# Altium footprint library CUSTOM PCB.PcbLib: 404 footprints (part 4 of 26)
Each footprint in its own frame and in the unit in brackets; x right, y up, seen from the top. Pads: shape width x height; smd on the part's side, far side on the other; paste and mask are expansions set on the pad; w line width, h text height; cw(c..) or ccw(c..) is an arc to the next point about the centre after c.
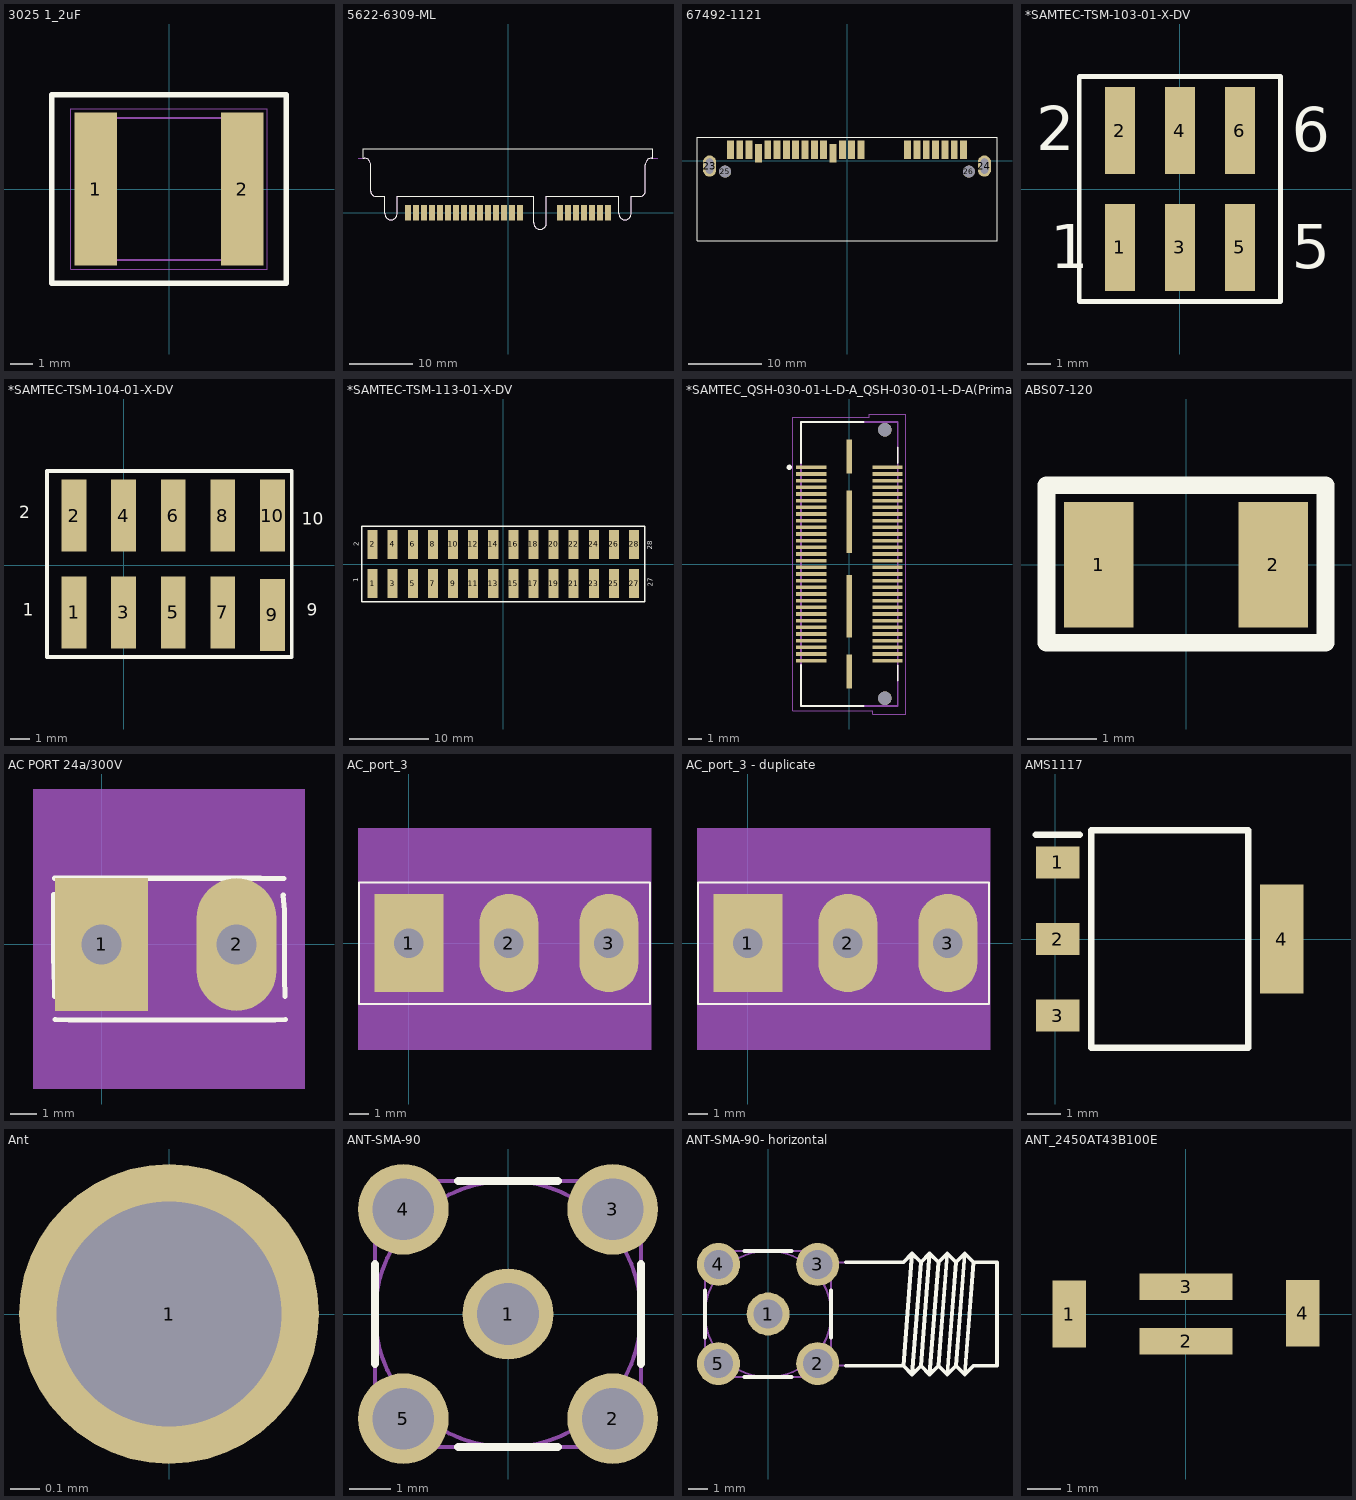
[diagram p3: the footprints below, top view; thin cyan lines are the x and y axes]

## 3025 1_2uF [mm]
pads (2):
  rect 1.89x6.81 smd: 1(-3.26,0) 2(3.26,0)
Top Overlay:
  lines w0.254: -5.207,-4.191 -5.207,4.191 5.207,4.191 5.207,-4.191 -5.207,-4.191
Mechanical 15:
  lines w0.1: -3.75,-3.15 -3.75,3.15 3.75,3.15 3.75,-3.15 -3.75,-3.15
Mechanical 20:
  lines w0.05: -4.355,-3.56 -4.355,3.56 4.355,3.56 4.355,-3.56 -4.355,-3.56
3D body "KTS501B125M76N0T00.stp": height 3.5, standoff 0, extent -3.75,-3.15 3.75,3.15

## 5622-6309-ML [mm]
pads (22):
  rect 0.94x2.5 smd: 1(15.875,0) 2(14.605,0) 3(13.335,0) 4(12.065,0) 5(10.795,0) 6(9.525,0) 7(8.255,0) 8(1.905,0) 9(0.635,0) 10(-0.635,0) 11(-1.905,0) 12(-3.175,0) 13(-4.445,0) 14(-5.715,0) 15(-6.985,0) 16(-8.255,0) 17(-9.525,0) 18(-10.795,0) 19(-12.065,0) 20(-13.335,0) 21(-14.605,0) 22(-15.875,0)
Top Overlay:
  lines w0.127: -22.936,8.65 -22.936,8.796 -22.936,10.16 22.936,10.16 22.936,8.806 22.936,8.65 22.78,8.65 ccw(c22.78,7.65) 21.78,7.65 21.78,3.41 cw(c21.02,3.41) 21.02,2.65 19.545,2.65 19.545,-0.1 cw(c18.545,-0.1) 17.545,-0.1 17.545,2.65 6.075,2.65 6.075,-1.62 cw(c5.075,-1.62) 4.075,-1.62 4.075,2.65 -17.555,2.65 -17.555,-0.1 cw(c-18.555,-0.1) -19.555,-0.1 -19.555,2.65 -21.03,2.65 cw(c-21.03,3.41) -21.79,3.41 -21.79,7.65 ccw(c-22.79,7.65) -22.79,8.65 -22.936,8.65
Mechanical 2:
  lines w0.127: -23.774,8.65 -22.79,8.65 cw(c-22.79,7.65) -21.79,7.65 -21.79,3.41 ccw(c-21.03,3.41) -21.03,2.65 -19.555,2.65 -19.555,-0.1 ccw(c-18.555,-0.1) -17.555,-0.1 -17.555,2.65 4.075,2.65 4.075,-1.62 ccw(c5.075,-1.62) 6.075,-1.62 6.075,2.65 17.545,2.65 17.545,-0.1 ccw(c18.545,-0.1) 19.545,-0.1 19.545,2.65 21.02,2.65 ccw(c21.02,3.41) 21.78,3.41 21.78,7.65 cw(c22.78,7.65) 22.78,8.65 23.764,8.65
3D body "5622-6309-ML.stp": height 3.8, standoff -1.93, extent -22.88,-2 22.88,10

## 67492-1121 [mil]
pads (26):
  rect 37x98 smd: 1(625,59.06) 2(575,59.06) 3(525,59.06) 4(475,59.06) 5(425,59.06) 6(375,59.06) 7(325,59.06) 8(75,59.06) 9(25,59.06) 10(-25,59.06) 11(-75,39.37) 12(-125,59.06) 13(-175,59.06) 14(-225,59.06) 15(-275,59.06) 16(-325,59.06) 17(-375,59.06) 18(-425,59.06) 19(-475,39.37) 20(-525,59.06) 21(-575,59.06) 22(-625,59.06)
  oval 70.87x113.39 / inner round 64 / far side round 64 hole 81.89 slot 39.37 at 0 deg: 23(-736.61,-29.13) 24(736.61,-29.13)
  round 64 hole 64: 25(-653.35,-59.06) 26(653.35,-59.06)
Top Overlay:
  lines w6: -804,-429 804,-429 804,125 -804,125 -804,-429
3D body "674921121.stp": height 139.76, standoff -78.74, extent -795.86,-425.19 795.87,81.5

## *SAMTEC-TSM-103-01-X-DV [mm]
pads (6):
  rect 1.27x3.68 smd: 1(-2.54,-2.476) 2(-2.54,2.476) 3(0,-2.476) 4(0,2.476) 5(2.54,-2.476) 6(2.54,2.476)
Top Overlay:
  lines w0.2: -4.26,-4.768 -4.26,4.768 4.26,4.768 4.26,-4.768 -4.26,-4.768
  text "1" at -5.496,-3.362 h1.88
  text "2" at -6.096,1.651 h1.88
  text "5" at 4.737,-3.362 h1.88
  text "6" at 4.737,1.592 h1.88
Top Paste:
  region: -3.175,-0.636 -1.905,-0.636 -1.905,-4.316 -3.175,-4.316
  region: -3.175,4.316 -1.905,4.316 -1.905,0.636 -3.175,0.636
  region: -0.635,-0.636 0.635,-0.636 0.635,-4.316 -0.635,-4.316
  region: -0.635,4.316 0.635,4.316 0.635,0.636 -0.635,0.636
  region: 1.905,-0.636 3.175,-0.636 3.175,-4.316 1.905,-4.316
  region: 1.905,4.316 3.175,4.316 3.175,0.636 1.905,0.636
Top Solder:
  region: -3.226,-0.585 -1.854,-0.585 -1.854,-4.367 -3.226,-4.367
  region: -3.226,4.367 -1.854,4.367 -1.854,0.585 -3.226,0.585
  region: -0.686,-0.585 0.686,-0.585 0.686,-4.367 -0.686,-4.367
  region: -0.686,4.367 0.686,4.367 0.686,0.585 -0.686,0.585
  region: 1.854,-0.585 3.226,-0.585 3.226,-4.367 1.854,-4.367
  region: 1.854,4.367 3.226,4.367 3.226,0.585 1.854,0.585
3D body "TSM-103-02-S-DV-TR.stp": height 11.94, standoff 0, extent -3.81,-3.721 3.81,3.721

## *SAMTEC-TSM-104-01-X-DV [mm]
pads (10):
  rect 1.27x3.68 smd: 1(-2.54,-2.412) 2(-2.54,2.54) 3(0,-2.412) 4(0,2.54) 5(2.54,-2.412) 6(2.54,2.54) 7(5.08,-2.412) 8(5.08,2.54) 9(7.62,-2.54) 10(7.62,2.54)
Top Overlay:
  lines w0.2: -3.918,-4.704 8.611,-4.704 8.611,4.832 -3.918,4.832 -3.918,-4.704
  text "10" at 9.119,2.071 h0.64
  text "9" at 9.373,-2.578 h0.64
  text "2" at -5.359,2.401 h0.64
  text "1" at -5.156,-2.578 h0.64
Top Paste:
  region: 1.905,4.38 3.175,4.38 3.175,0.7 1.905,0.7
  region: 1.905,-0.572 3.175,-0.572 3.175,-4.252 1.905,-4.252
  region: -0.635,4.38 0.635,4.38 0.635,0.7 -0.635,0.7
  region: -0.635,-0.572 0.635,-0.572 0.635,-4.252 -0.635,-4.252
  region: -3.175,4.38 -1.905,4.38 -1.905,0.7 -3.175,0.7
  region: -3.175,-0.572 -1.905,-0.572 -1.905,-4.252 -3.175,-4.252
Top Solder:
  region: 1.854,4.431 3.226,4.431 3.226,0.649 1.854,0.649
  region: 1.854,-0.521 3.226,-0.521 3.226,-4.303 1.854,-4.303
  region: -0.686,4.431 0.686,4.431 0.686,0.649 -0.686,0.649
  region: -0.686,-0.521 0.686,-0.521 0.686,-4.303 -0.686,-4.303
  region: -3.226,4.431 -1.854,4.431 -1.854,0.649 -3.226,0.649
  region: -3.226,-0.521 -1.854,-0.521 -1.854,-4.303 -3.226,-4.303
3D body "TSM-105-01-S-DV.stp": height 9.6, standoff -0.05, extent -3.81,-3.848 8.89,3.848

## *SAMTEC-TSM-113-01-X-DV [mm]
pads (28):
  rect 1.27x3.68 smd: 1(-16.51,-2.476) 2(-16.51,2.476) 3(-13.97,-2.476) 4(-13.97,2.476) 5(-11.43,-2.476) 6(-11.43,2.476) 7(-8.89,-2.476) 8(-8.89,2.476) 9(-6.35,-2.476) 10(-6.35,2.476) 11(-3.81,-2.476) 12(-3.81,2.476) 13(-1.27,-2.476) 14(-1.27,2.476) 15(1.27,-2.476) 16(1.27,2.476) 17(3.81,-2.476) 18(3.81,2.476) 19(6.35,-2.476) 20(6.35,2.476) 21(8.89,-2.476) 22(8.89,2.476) 23(11.43,-2.476) 24(11.43,2.476) 25(13.97,-2.476) 26(13.97,2.476) 27(16.51,-2.476) 28(16.51,2.476)
Top Overlay:
  lines w0.2: -17.888,-4.768 -5.359,-4.768 15.342,-4.768 17.882,-4.768 17.882,4.768 15.342,4.768 -5.359,4.768 -17.888,4.768 -17.888,-4.768
  text "2" at -18.237,2.261 h0.64
  text "1" at -18.288,-2.286 h0.64
  text "27" at 18.898,-2.87 h0.64
  text "28" at 18.821,1.803 h0.64
3D body "TSM-114-01-L-DV.stp": height 9.61, standoff -0.04, extent -17.78,-3.848 17.78,3.848

## *SAMTEC_QSH-030-01-L-D-A_QSH-030-01-L-D-A(Primary) [mm]
pads (66):
  rect 2.27x0.279 smd: 1(-2.865,7.25) 2(2.865,7.25) 3(-2.865,6.75) 4(2.865,6.75) 5(-2.865,6.25) 6(2.865,6.25) 7(-2.865,5.75) 8(2.865,5.75) 9(-2.865,5.25) 10(2.865,5.25) 11(-2.865,4.75) 12(2.865,4.75) 13(-2.865,4.25) 14(2.865,4.25) 15(-2.865,3.75) 16(2.865,3.75) 17(-2.865,3.25) 18(2.865,3.25) 19(-2.865,2.75) 20(2.865,2.75) 21(-2.865,2.25) 22(2.865,2.25) 23(-2.865,1.75) 24(2.865,1.75) 25(-2.865,1.25) 26(2.865,1.25) 27(-2.865,0.75) 28(2.865,0.75) 29(-2.865,0.25) 30(2.865,0.25) 31(-2.865,-0.25) 32(2.865,-0.25) 33(-2.865,-0.75) 34(2.865,-0.75) 35(-2.865,-1.25) 36(2.865,-1.25) 37(-2.865,-1.75) 38(2.865,-1.75) 39(-2.865,-2.25) 40(2.865,-2.25) 41(-2.865,-2.75) 42(2.865,-2.75) 43(-2.865,-3.25) 44(2.865,-3.25) 45(-2.865,-3.75) 46(2.865,-3.75) 47(-2.865,-4.25) 48(2.865,-4.25) 49(-2.865,-4.75) 50(2.865,-4.75) 51(-2.865,-5.25) 52(2.865,-5.25) 53(-2.865,-5.75) 54(2.865,-5.75) 55(-2.865,-6.25) 56(2.865,-6.25) 57(-2.865,-6.75) 58(2.865,-6.75) 59(-2.865,-7.25) 60(2.865,-7.25)
  round 1.02 hole 1.02 unplated: None(2.67,-10.065) None(2.67,10.065)
  rect 0.43x2.54 smd: SH1(0,8.065) SH4(0,-8.065)
  rect 0.43x4.7 smd: SH2(0,3.175) SH3(0,-3.175)
Top Overlay:
  circle w0.2: c-4.5,7.25 r0.1
  lines w0.127: -3.62,-7.55 -3.62,-10.655 1.08,-10.655 ; -3.62,7.55 -3.62,10.655 1.08,10.655 ; 3.62,-8.75 3.62,-7.6 ; 3.62,7.55 3.62,8.75
Mechanical 4:
  lines w0.127: -3.62,-10.655 3.62,-10.655 ; -3.62,-10.655 -3.62,10.655 ; -3.62,-10.655 3.62,-10.655 ; -3.62,-10.655 -3.62,10.655 ; -3.62,10.655 3.62,10.655 ; -3.62,10.655 3.62,10.655 ; 3.62,-10.655 3.62,10.655 ; 3.62,-10.655 3.62,10.655
Mechanical 16:
  lines w0.05: -4.25,-11 -4.25,11 1.5,11 1.5,11.25 4.25,11.25 4.25,-11.25 1.75,-11.25 1.75,-11 -4.25,-11
3D body "Samtec-QSH-030-01-L-D-A.stp": height 3.25, standoff -0.75, extent -3.746,-10.617 3.747,10.693

## ABS07-120 [mm]
pads (2):
  rect 1x1.8 smd: 1(-1.25,0) 2(1.25,0)
Top Overlay:
  lines w0.254: -2,-1.118 2,-1.118 2,1.143 -2,1.143 -2,-1.118
3D body "ABS07-120.STEP": height 0.89, standoff 0, extent -1.603,-0.752 1.603,0.752

## AC PORT 24a/300V [mm] "Connector; Header; 2 Position"
pads (2):
  rect 3.5x5 hole 1.5: 1(0,0)
  oval 3x5 hole 1.5: 2(5.08,0)
Top Overlay:
  lines w0.19: -1.8,-0.67 -1.78,-1.96 ; -1.748,-2.834 -1.218,-2.844 ; 5.978,2.494 6.871,2.484 ; 6.529,-2.844 6.932,-2.834 ; 6.84,1.86 6.89,1.28 ; 6.89,-1.26 6.9,-1.96
  lines w0.2: -1.8,-0.67 -1.8,1.87 ; -1.769,2.494 5.978,2.494 ; -1.218,-2.844 0.719,-2.844 4.592,-2.844 6.529,-2.844 ; 6.89,-1.26 6.89,1.28
Mechanical 1:
  rectangle: -2.59,-5.444 7.664,5.857
3D body "User Library-2 Way PCB Screw Terminal Block 5_08mm.step": height 15.2, standoff -3.5, extent -2.52,-4.56 7.64,4.44

## AC_port_3 [mm] "5mm pitch"
pads (3):
  rect 3.5x5 hole 1.5: 1(0,0)
  oval 3x5 hole 1.5: 2(5.08,0) 3(10.16,0)
Top Overlay:
  lines w0.1: -2.54,-3.099 -2.54,3.073 12.243,3.073 12.243,-3.099 -2.54,-3.099
Mechanical 1:
  rectangle: -2.59,-5.444 12.319,5.857
3D body "User Library-3 Way PCB Screw Terminal Block 5_08mm.STEP": height 15.2, standoff -3.5, extent -2.921,-4.525 12.319,4.475
3D body: height 3.8, standoff 0, extent 7.391,8.941 7.391,8.941

## AC_port_3 - duplicate [mm] "5mm pitch"
pads (3):
  rect 3.5x5 hole 1.5: 1(0,0)
  oval 3x5 hole 1.5: 2(5.08,0) 3(10.16,0)
Top Overlay:
  lines w0.1: -2.54,-3.099 -2.54,3.073 12.243,3.073 12.243,-3.099 -2.54,-3.099
Mechanical 1:
  rectangle: -2.59,-5.444 12.319,5.857
3D body "User Library-2 Way PCB Screw Terminal Block 5_08mm.step": height 15.2, standoff -3.5, extent 2.515,-4.547 12.675,4.453
3D body: height 5, standoff 0, extent 14.16,0.736 14.16,0.736
3D body: height 3.8, standoff 0, extent 7.391,8.941 7.391,8.941

## AMS1117 [mm] "SOT223"
pads (4):
  rect 1.3x0.95 smd: 1(0.079,2.29) 2(0.079,0) 3(0.079,-2.29)
  rect 1.3x3.25 smd: 4(6.779,0)
Top Overlay:
  lines w0.2: -0.571,3.115 0.729,3.115 ; 1.079,-3.252 1.079,3.252 5.779,3.252 5.779,-3.252 1.079,-3.252
3D body "AMS1117.SLDPRT": height 1.81, standoff -0.05, extent -0.213,-3.252 6.787,3.253

## Ant [mil]
pads (1):
  round 40 hole 30: 1(0,0)

## ANT-SMA-90 [mm] "50 Ohm SMA Right Angle PCB Jack"
height 9.6
pads (5):
  round 2.2 hole 1.5: 1(0,0) 2(2.54,-2.54) 3(2.54,2.54) 4(-2.54,2.54) 5(-2.54,-2.54)
Top Overlay:
  lines w0.2: -3.23,-1.208 -3.23,1.208 ; -1.208,-3.23 1.208,-3.23 ; -1.208,3.23 1.208,3.23 ; 3.23,-1.208 3.23,1.208
Mechanical 8:
  lines w0.1: -3.54,-2.54 -2.54,-2.54 ; -3.54,2.54 -2.54,2.54 ; -2.54,-3.54 -2.54,-2.54 ; -2.54,-1.54 -2.54,-2.54 ; -2.54,1.54 -2.54,2.54 ; -2.54,3.54 -2.54,2.54 ; -1.54,-2.54 -2.54,-2.54 ; -1.54,2.54 -2.54,2.54 ; -1,0 0,0 ; 0,-1 0,0 ; 0,1 0,0 ; 1,0 0,0 ; 1.54,-2.54 2.54,-2.54 ; 1.54,2.54 2.54,2.54 ; 2.54,-3.54 2.54,-2.54 ; 2.54,-1.54 2.54,-2.54 ; 2.54,1.54 2.54,2.54 ; 2.54,3.54 2.54,2.54 ; 3.54,-2.54 2.54,-2.54 ; 3.54,2.54 2.54,2.54
Mechanical 14:
  circle w0.1: c0,0 r3.23
  circle w0.1: c0,0 r0.63
  lines w0.1: 2.558,-3.23 3.23,-2.558 ; -3.23,-3.23 3.23,-3.23 3.23,3.23 -3.23,3.23 -3.23,-3.23
3D body "c-5-1814832-1-b-3d.stp": height 9.65, standoff -3.85, extent -3.2,-3.2 3.2,3.2

## ANT-SMA-90- horizontal [mm] "50 Ohm SMA Right Angle PCB Jack"
height 9.6
pads (5):
  round 2.2 hole 1.5: 1(0,0) 2(2.54,-2.54) 3(2.54,2.54) 4(-2.54,2.54) 5(-2.54,-2.54)
Top Overlay:
  lines w0.2: -3.23,-1.208 -3.23,1.208 ; -1.208,-3.23 1.208,-3.23 ; -1.208,3.23 1.208,3.23 ; 3.23,-1.208 3.23,1.208 ; 4,-2.65 6.93,-2.65 ; 4,2.65 6.93,2.65 7.38,3.1 ; 6.93,-2.65 7.38,3.1 ; 6.93,-2.65 7.38,-3.1 ; 7.38,-3.1 7.83,2.65 ; 7.38,-3.1 7.83,-2.65 ; 7.38,3.1 7.83,2.65 ; 7.83,-2.65 8.28,3.1 ; 7.83,-2.65 8.28,-3.1 ; 7.83,2.65 8.28,3.1 ; 8.28,-3.1 8.73,2.65 ; 8.28,-3.1 8.73,-2.65 ; 8.28,3.1 8.73,2.65 ; 8.73,-2.65 9.18,3.1 ; 8.73,-2.65 9.18,-3.1 ; 8.73,2.65 9.18,3.1 ; 9.18,-3.1 9.63,2.65 ; 9.18,-3.1 9.63,-2.65 ; 9.18,3.1 9.63,2.65 ; 9.63,-2.65 10.08,3.1 ; 9.63,-2.65 10.08,-3.1 ; 9.63,2.65 10.08,3.1 ; 10.08,-3.1 10.53,2.65 ; 10.08,-3.1 10.53,-2.65 11.73,-2.65 11.73,2.65 10.53,2.65 ; 10.08,3.1 10.53,2.65
Mechanical 8:
  lines w0.1: -3.54,-2.54 -2.54,-2.54 ; -3.54,2.54 -2.54,2.54 ; -2.54,-3.54 -2.54,-2.54 ; -2.54,-1.54 -2.54,-2.54 ; -2.54,1.54 -2.54,2.54 ; -2.54,3.54 -2.54,2.54 ; -1.54,-2.54 -2.54,-2.54 ; -1.54,2.54 -2.54,2.54 ; -1,0 0,0 ; 0,-1 0,0 ; 0,1 0,0 ; 1,0 0,0 ; 1.54,-2.54 2.54,-2.54 ; 1.54,2.54 2.54,2.54 ; 2.54,-3.54 2.54,-2.54 ; 2.54,-1.54 2.54,-2.54 ; 2.54,1.54 2.54,2.54 ; 2.54,3.54 2.54,2.54 ; 3.54,-2.54 2.54,-2.54 ; 3.54,2.54 2.54,2.54
Mechanical 14:
  circle w0.1: c0,0 r3.23
  circle w0.1: c0,0 r0.63
  lines w0.1: 2.558,-3.23 3.23,-2.558 ; 3.23,-2.65 6.93,-2.65 ; 3.23,2.65 6.93,2.65 7.38,3.1 ; 6.93,-2.65 7.38,3.1 ; 6.93,-2.65 7.38,-3.1 ; 7.38,-3.1 7.83,2.65 ; 7.38,-3.1 7.83,-2.65 ; 7.38,3.1 7.83,2.65 ; 7.83,-2.65 8.28,3.1 ; 7.83,-2.65 8.28,-3.1 ; 7.83,2.65 8.28,3.1 ; 8.28,-3.1 8.73,2.65 ; 8.28,-3.1 8.73,-2.65 ; 8.28,3.1 8.73,2.65 ; 8.73,-2.65 9.18,3.1 ; 8.73,-2.65 9.18,-3.1 ; 8.73,2.65 9.18,3.1 ; 9.18,-3.1 9.63,2.65 ; 9.18,-3.1 9.63,-2.65 ; 9.18,3.1 9.63,2.65 ; 9.63,-2.65 10.08,3.1 ; 9.63,-2.65 10.08,-3.1 ; 9.63,2.65 10.08,3.1 ; 10.08,-3.1 10.53,2.65 ; 10.08,-3.1 10.53,-2.65 11.73,-2.65 11.73,2.65 10.53,2.65 ; 10.08,3.1 10.53,2.65 ; -3.23,-3.23 3.23,-3.23 3.23,3.23 -3.23,3.23 -3.23,-3.23
3D body "User Library-SMA-RIGHTANGLE-TE.x_t": height 9.6, standoff -3.9, extent -3.25,-3.2 15.75,3.2

## ANT_2450AT43B100E [mm]
pads (4):
  rect 1x2 smd: 1(-3.5,0) 4(3.5,0.025)
  rect 2.8x0.8 smd: 2(0,-0.815) 3(0,0.815)
3D body: height 2, standoff 0, extent -3.5,-1 3.5,1
3D body: height 2.1, standoff 0, extent -3.504,-1.041 -2.976,1.041
3D body: height 2.1, standoff 0, extent 2.976,-1.041 3.504,1.041
3D body: height 2.01, standoff 0, extent -2.819,-0.216 -1.702,0.216